# Altium footprint library Integrados.PcbLib: 96 footprints (part 6 of 6)
Each footprint in its own frame and in the unit in brackets; x right, y up, seen from the top. Pads: shape width x height; smd on the part's side, far side on the other; paste and mask are expansions set on the pad; w line width, h text height; cw(c..) or ccw(c..) is an arc to the next point about the centre after c.
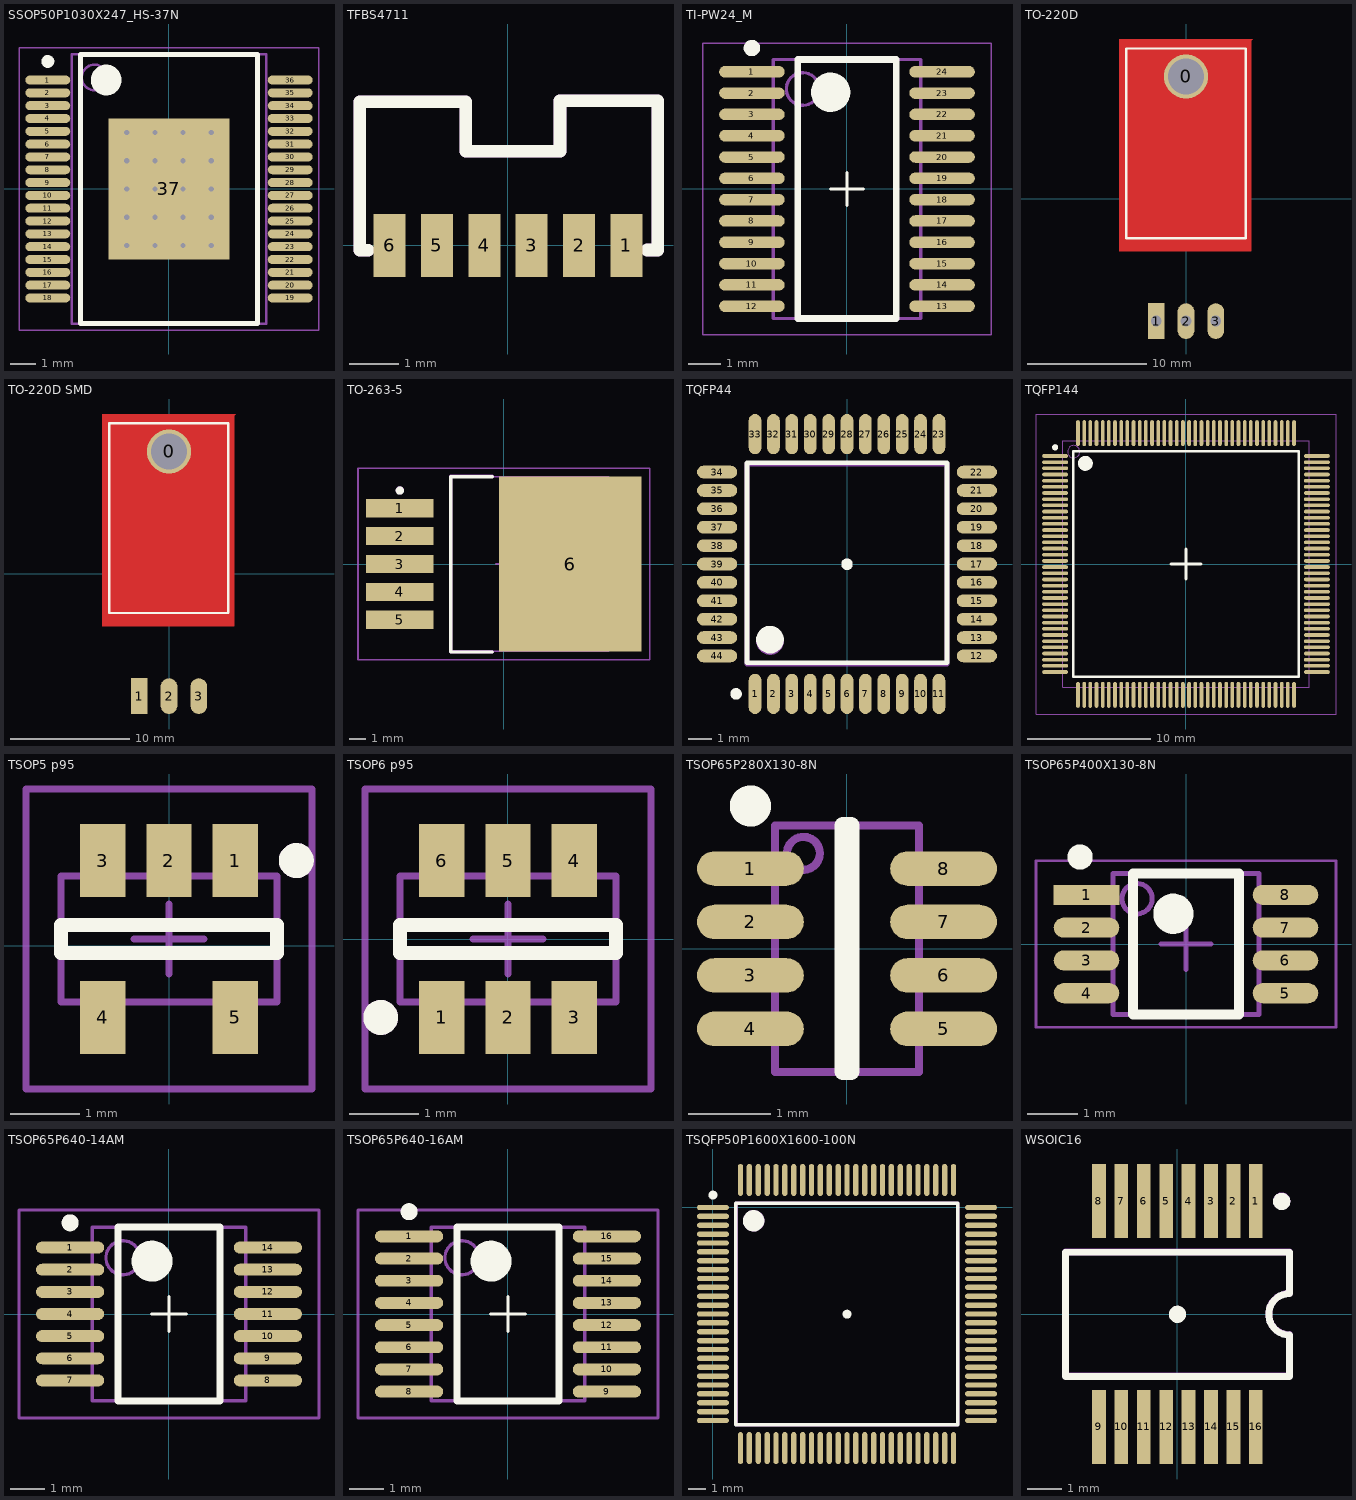
[diagram p5: the footprints below, top view; thin cyan lines are the x and y axes]

## SSOP50P1030X247_HS-37N [mm] "SSOP, 36-Leads, Body 10,30x7,50mm, Pitch 0,50mm, Thermal Pad 5,50x4,70mm, IPC Medium Density"
height 2.47
pads (37):
  oval 1.75x0.35 smd: 1(-4.725,4.25) 2(-4.725,3.75) 3(-4.725,3.25) 4(-4.725,2.75) 5(-4.725,2.25) 6(-4.725,1.75) 7(-4.725,1.25) 8(-4.725,0.75) 9(-4.725,0.25) 10(-4.725,-0.25) 11(-4.725,-0.75) 12(-4.725,-1.25) 13(-4.725,-1.75) 14(-4.725,-2.25) 15(-4.725,-2.75) 16(-4.725,-3.25) 17(-4.725,-3.75) 18(-4.725,-4.25) 19(4.725,-4.25) 20(4.725,-3.75) 21(4.725,-3.25) 22(4.725,-2.75) 23(4.725,-2.25) 24(4.725,-1.75) 25(4.725,-1.25) 26(4.725,-0.75) 27(4.725,-0.25) 28(4.725,0.25) 29(4.725,0.75) 30(4.725,1.25) 31(4.725,1.75) 32(4.725,2.25) 33(4.725,2.75) 34(4.725,3.25) 35(4.725,3.75) 36(4.725,4.25)
  rect 4.7x5.5 smd: 37(0,0)
via -1.65,2.2 diameter 0.5 hole 0.2
via -0.55,2.2 diameter 0.5 hole 0.2
via 0.55,2.2 diameter 0.5 hole 0.2
via 1.65,2.2 diameter 0.5 hole 0.2
via -1.65,1.1 diameter 0.5 hole 0.2
via -0.55,1.1 diameter 0.5 hole 0.2
via 0.55,1.1 diameter 0.5 hole 0.2
via 1.65,1.1 diameter 0.5 hole 0.2
via -1.65,0 diameter 0.5 hole 0.2
via -0.55,0 diameter 0.5 hole 0.2
via 0.55,0 diameter 0.5 hole 0.2
via 1.65,0 diameter 0.5 hole 0.2
via -1.65,-1.1 diameter 0.5 hole 0.2
via -0.55,-1.1 diameter 0.5 hole 0.2
via 0.55,-1.1 diameter 0.5 hole 0.2
via 1.65,-1.1 diameter 0.5 hole 0.2
via -1.65,-2.2 diameter 0.5 hole 0.2
via -0.55,-2.2 diameter 0.5 hole 0.2
via 0.55,-2.2 diameter 0.5 hole 0.2
via 1.65,-2.2 diameter 0.5 hole 0.2
Top Overlay:
  circle w0.25: c-4.725,4.975 r0.125
  circle w0.6: c-2.45,4.25 r0.3
  circle w0.25: c0,-0.01 r0.125
  lines w0.2: -3.45,-5.25 -3.45,5.25 3.45,5.25 3.45,-5.25 -3.45,-5.25
Mechanical 15:
  lines w0.05: -5.85,-5.5 -5.85,5.5 5.85,5.5 5.85,-5.5 -5.85,-5.5
  lines w0.1: -0.5,0 0.5,0 ; 0,-0.5 0,0.5
Mechanical 29:
  circle w0.1: c-2.9,4.35 r0.5
  lines w0.1: -3.8,-5.25 -3.8,5.25 3.8,5.25 3.8,-5.25 -3.8,-5.25
  text "'.Designator'" at -0.039,0.372 h0.5
3D body "SSOP50P1030X247_HS-37N.step": height 2.47, standoff 0, extent -5.15,-5.25 5.15,5.25

## TFBS4711 [mm] "TXRX IRDA 115.2KBIT 1.9MM 6-SMD"
pads (6):
  rect 0.64x1.27 smd: 1(2.375,0) 2(1.425,0) 3(0.475,0) 4(-0.475,0) 5(-1.425,0) 6(-2.375,0)
Top Overlay:
  lines w0.254: -2.975,-0.1 -2.805,-0.1 ; -2.975,-0.09 -2.975,2.88 -0.845,2.88 -0.845,1.89 1.045,1.89 1.045,2.9 3.005,2.9 3.005,2.88 3.005,-0.09 2.795,-0.09
Mechanical 29:
  lines w0.254: -2.975,-0.1 -2.805,-0.1 ; -2.975,-0.09 -2.975,2.88 -0.845,2.88 -0.845,1.89 1.045,1.89 1.045,2.9 3.005,2.9 3.005,2.88 3.005,-0.09 2.795,-0.09
  text "'.Designator'" at -2.772,1.001 h0.5
3D body "TFBS4711.STEP": height 1.91, standoff -0.01, extent -2.985,-0.1 3.015,2.91

## TI-PW24_M [mm] "SOP, 24-Leads, Body 7.8x4.4mm, Pitch 0.65mm, IPC Low Density"
height 1.2
pads (24):
  oval 2x0.35 smd: 1(-2.9,3.575) 2(-2.9,2.925) 3(-2.9,2.275) 4(-2.9,1.625) 5(-2.9,0.975) 6(-2.9,0.325) 7(-2.9,-0.325) 8(-2.9,-0.975) 9(-2.9,-1.625) 10(-2.9,-2.275) 11(-2.9,-2.925) 12(-2.9,-3.575) 13(2.9,-3.575) 14(2.9,-2.925) 15(2.9,-2.275) 16(2.9,-1.625) 17(2.9,-0.975) 18(2.9,-0.325) 19(2.9,0.325) 20(2.9,0.975) 21(2.9,1.625) 22(2.9,2.275) 23(2.9,2.925) 24(2.9,3.575)
Top Overlay:
  circle w0.25: c-2.9,4.3 r0.125
  circle w0.6: c-0.5,2.95 r0.3
  lines w0.1: -0.5,0 0.5,0 ; 0,-0.5 0,0.5
  lines w0.2: -1.5,-3.95 -1.5,3.95 1.5,3.95 1.5,-3.95 -1.5,-3.95
Mechanical 15:
  lines w0.05: -4.4,-4.45 -4.4,4.45 4.4,4.45 4.4,-4.45 -4.4,-4.45
Mechanical 29:
  circle w0.1: c-1.35,3.05 r0.5
  lines w0.1: -2.25,-3.95 -2.25,3.95 2.25,3.95 2.25,-3.95 -2.25,-3.95
  text "'.Designator'" at 0.039,-0.382 h0.5
3D body: height 1.2, standoff 0.05, extent -2.25,-3.95 2.25,3.95

## TO-220D [mm] "TO-220D acostado"
pads (4):
  round 3.7 hole 3: 0(0,10.25)
  rect 1.4x3 hole 0.9: 1(-2.5,-10.25)
  oval 1.4x3 hole 0.9: 2(0,-10.25) 3(2.5,-10.25)
Top Layer:
  region: -5.588,13.387 5.588,13.387 5.461,13.26 5.461,-4.393 -5.588,-4.393
Top Overlay:
  lines w0.2: -5,-3.31 0,-3.31 5,-3.31 5,12.59 -5,12.59 -5,-3.31
Mechanical 29:
  lines w0.2: -5,-3.25 -5,12.65 5,12.65 5,-3.25 0,-3.25 -5,-3.25
  text "'.Designator'" at -2.812,-3.589 h0.5
3D body "T0220-A.STEP": height 4, standoff -0.74, extent -4.988,-10.428 5.012,12.722

## TO-220D SMD [mm] "TO-220D acostado"
pads (4):
  round 3.7 hole 3: 0(0,10.25)
  rect 1.4x3 smd: 1(-2.5,-10.25)
  oval 1.4x3 smd: 2(0,-10.25) 3(2.5,-10.25)
Top Layer:
  region: -5.588,13.387 5.588,13.387 5.461,13.26 5.461,-4.393 -5.588,-4.393
Top Overlay:
  lines w0.2: -5.02,-3.29 -5.02,12.61 4.98,12.61 4.98,-3.29 -0.02,-3.29 -5.02,-3.29
Mechanical 29:
  lines w0.2: -5,-3.25 0,-3.25 5,-3.25 5,12.65 -5,12.65 -5,-3.25
  text "'.Designator'" at -0.01,-0.1 h0.5
3D body "TO-220-1 SMD.STEP": height 4.5, standoff 0, extent -4.938,-10.525 4.962,12.885

## TO-263-5 [mm] "D2-PAK, 6-Leads, Body 9x10.2mm, Pitch 1.7mm, Lead Span 15.2mm, IPC Low Density"
height 4.83
pads (6):
  rect 4.1x1.1 smd: 1(-6.35,3.4) 2(-6.35,1.7) 3(-6.35,0) 4(-6.35,-1.7) 5(-6.35,-3.4)
  rect 8.7x10.7 smd: 6(4.05,0)
Top Overlay:
  circle w0.25: c-6.35,4.48 r0.125
  lines w0.2: -0.7,-5.37 -3.25,-5.37 -3.25,5.33 -0.7,5.33
Mechanical 13:
  lines w0.1: -3.25,-5.325 6.4,-5.325 6.4,5.325 -3.25,5.325 -3.25,-5.325
Mechanical 29:
  circle w0.25: c-6.35,4.5 r0.125
  lines w0.1: -0.5,0 0.5,0 ; 0,-0.5 0,0.5 ; -8.9,-5.85 8.9,-5.85 8.9,5.85 -8.9,5.85 -8.9,-5.85
  lines w0.2: -0.7,-5.35 -3.25,-5.35 -3.25,5.35 -0.7,5.35
  text "'.Designator'" at -0.352,-0.069 h0.5
3D body "TO-263-5.STEP": height 4.56, standoff 0, extent -7.259,-5.054 6.756,5.106

## TQFP44 [mm]
pads (44):
  oval 0.55x1.75 smd: 1(-4,-5.65) 2(-3.2,-5.65) 3(-2.4,-5.65) 4(-1.6,-5.65) 5(-0.8,-5.65) 6(0,-5.65) 7(0.8,-5.65) 8(1.6,-5.65) 9(2.4,-5.65) 10(3.2,-5.65) 11(4,-5.65) 23(4,5.65) 24(3.2,5.65) 25(2.4,5.65) 26(1.6,5.65) 27(0.8,5.65) 28(0,5.65) 29(-0.8,5.65) 30(-1.6,5.65) 31(-2.4,5.65) 32(-3.2,5.65) 33(-4,5.65)
  oval 1.75x0.55 smd: 12(5.65,-4) 13(5.65,-3.2) 14(5.65,-2.4) 15(5.65,-1.6) 16(5.65,-0.8) 17(5.65,0) 18(5.65,0.8) 19(5.65,1.6) 20(5.65,2.4) 21(5.65,3.2) 22(5.65,4) 34(-5.65,4) 35(-5.65,3.2) 36(-5.65,2.4) 37(-5.65,1.6) 38(-5.65,0.8) 39(-5.65,0) 40(-5.65,-0.8) 41(-5.65,-1.6) 42(-5.65,-2.4) 43(-5.65,-3.2) 44(-5.65,-4)
Top Overlay:
  circle w0.25: c0,-0.01 r0.125
  circle w0.25: c-4.825,-5.65 r0.125
  circle w0.6: c-3.35,-3.29 r0.3
  lines w0.2: -4.35,-4.29 4.35,-4.29 4.35,4.41 -4.35,4.41 -4.35,-4.29
Mechanical 29:
  circle w0.6: c-3.35,-3.35 r0.3
  lines w0.2: -4.35,-4.35 -4.35,4.35 4.35,4.35 4.35,-4.35 -4.35,-4.35
  text "'.Designator'" at -0.342,-0.019 h0.5
3D body "TQFP44-1.step": height 1.1, standoff 0, extent -6.048,-6.048 5.969,5.969

## TQFP144 [mm] "144-Pin Plastic Thin Quad Flat Pack (TQFP144), IPC Low Density"
height 1.6
pads (144):
  oval 2.1x0.3 smd: 1(-10.6,8.75) 2(-10.6,8.25) 3(-10.6,7.75) 4(-10.6,7.25) 5(-10.6,6.75) 6(-10.6,6.25) 7(-10.6,5.75) 8(-10.6,5.25) 9(-10.6,4.75) 10(-10.6,4.25) 11(-10.6,3.75) 12(-10.6,3.25) 13(-10.6,2.75) 14(-10.6,2.25) 15(-10.6,1.75) 16(-10.6,1.25) 17(-10.6,0.75) 18(-10.6,0.25) 19(-10.6,-0.25) 20(-10.6,-0.75) 21(-10.6,-1.25) 22(-10.6,-1.75) 23(-10.6,-2.25) 24(-10.6,-2.75) 25(-10.6,-3.25) 26(-10.6,-3.75) 27(-10.6,-4.25) 28(-10.6,-4.75) 29(-10.6,-5.25) 30(-10.6,-5.75) 31(-10.6,-6.25) 32(-10.6,-6.75) 33(-10.6,-7.25) 34(-10.6,-7.75) 35(-10.6,-8.25) 36(-10.6,-8.75) 73(10.6,-8.75) 74(10.6,-8.25) 75(10.6,-7.75) 76(10.6,-7.25) 77(10.6,-6.75) 78(10.6,-6.25) 79(10.6,-5.75) 80(10.6,-5.25) 81(10.6,-4.75) 82(10.6,-4.25) 83(10.6,-3.75) 84(10.6,-3.25) 85(10.6,-2.75) 86(10.6,-2.25) 87(10.6,-1.75) 88(10.6,-1.25) 89(10.6,-0.75) 90(10.6,-0.25) 91(10.6,0.25) 92(10.6,0.75) 93(10.6,1.25) 94(10.6,1.75) 95(10.6,2.25) 96(10.6,2.75) 97(10.6,3.25) 98(10.6,3.75) 99(10.6,4.25) 100(10.6,4.75) 101(10.6,5.25) 102(10.6,5.75) 103(10.6,6.25) 104(10.6,6.75) 105(10.6,7.25) 106(10.6,7.75) 107(10.6,8.25) 108(10.6,8.75)
  oval 0.3x2.1 smd: 37(-8.75,-10.6) 38(-8.25,-10.6) 39(-7.75,-10.6) 40(-7.25,-10.6) 41(-6.75,-10.6) 42(-6.25,-10.6) 43(-5.75,-10.6) 44(-5.25,-10.6) 45(-4.75,-10.6) 46(-4.25,-10.6) 47(-3.75,-10.6) 48(-3.25,-10.6) 49(-2.75,-10.6) 50(-2.25,-10.6) 51(-1.75,-10.6) 52(-1.25,-10.6) 53(-0.75,-10.6) 54(-0.25,-10.6) 55(0.25,-10.6) 56(0.75,-10.6) 57(1.25,-10.6) 58(1.75,-10.6) 59(2.25,-10.6) 60(2.75,-10.6) 61(3.25,-10.6) 62(3.75,-10.6) 63(4.25,-10.6) 64(4.75,-10.6) 65(5.25,-10.6) 66(5.75,-10.6) 67(6.25,-10.6) 68(6.75,-10.6) 69(7.25,-10.6) 70(7.75,-10.6) 71(8.25,-10.6) 72(8.75,-10.6) 109(8.75,10.6) 110(8.25,10.6) 111(7.75,10.6) 112(7.25,10.6) 113(6.75,10.6) 114(6.25,10.6) 115(5.75,10.6) 116(5.25,10.6) 117(4.75,10.6) 118(4.25,10.6) 119(3.75,10.6) 120(3.25,10.6) 121(2.75,10.6) 122(2.25,10.6) 123(1.75,10.6) 124(1.25,10.6) 125(0.75,10.6) 126(0.25,10.6) 127(-0.25,10.6) 128(-0.75,10.6) 129(-1.25,10.6) 130(-1.75,10.6) 131(-2.25,10.6) 132(-2.75,10.6) 133(-3.25,10.6) 134(-3.75,10.6) 135(-4.25,10.6) 136(-4.75,10.6) 137(-5.25,10.6) 138(-5.75,10.6) 139(-6.25,10.6) 140(-6.75,10.6) 141(-7.25,10.6) 142(-7.75,10.6) 143(-8.25,10.6) 144(-8.75,10.6)
Top Overlay:
  circle w0.6: c-8.15,8.15 r0.3
  circle w0.25: c-10.6,9.45 r0.125
  lines w0.2: -9.15,-9.15 9.15,-9.15 9.15,9.15 -9.15,9.15 -9.15,-9.15
  lines w0.254: -1.22,0 0,0 ; 0,-1.22 0,0 ; 0,1.22 0,0 ; 1.22,0 0,0
Mechanical 15:
  lines w0.1: -0.5,0 0.5,0 ; 0,-0.5 0,0.5 ; -12.15,-12.15 12.15,-12.15 12.15,12.15 -12.15,12.15 -12.15,-12.15
Mechanical 29:
  circle w0.1: c-9.1,9.1 r0.5
  lines w0.1: -10,-10 10,-10 10,10 -10,10 -10,-10
  text "'.Designator'" at -0.392,-0.019 h0.5
3D body "TQFP144.step": height 1.1, standoff 0, extent -11.019,-10.994 10.998,11.024

## TSOP5 p95 [mm]
pads (5):
  rect 0.65x1.05 smd: 1(0.95,1.225) 2(0,1.225) 3(-0.95,1.225) 4(-0.95,-1.025) 5(0.95,-1.025)
Top Overlay:
  circle w0.25: c1.825,1.225 r0.125
  lines w0.2: -1.55,-0.1 -1.55,0.3 1.55,0.3 1.55,-0.1 -1.55,-0.1
Mechanical 15:
  lines w0.1: -0.5,0.1 0.5,0.1 ; 0,-0.4 0,0.6 ; -2.05,-2.05 2.05,-2.05 2.05,2.25 -2.05,2.25 -2.05,-2.05
Mechanical 29:
  circle w0.25: c1.825,1.225 r0.125
  lines w0.1: -1.55,-0.8 -1.55,1 1.55,1 1.55,-0.8 -1.55,-0.8
  text "'.Designator'" at 0.371,0.118 h0.5
Mechanical 30:
  circle w0.25: c1.825,1.225 r0.125
  lines w0.1: -1.55,-0.8 -1.55,1 1.55,1 1.55,-0.8 -1.55,-0.8
  text "'.Designator'" at 0.371,0.118 h0.5
3D body "5-TSOP.step": height 1, standoff -0.1, extent -1.55,-1.45 1.55,1.55

## TSOP6 p95 [mm]
pads (6):
  rect 0.65x1.05 smd: 1(-0.95,-1.125) 2(0,-1.125) 3(0.95,-1.125) 4(0.95,1.125) 5(0,1.125) 6(-0.95,1.125)
Top Overlay:
  circle w0.25: c-1.825,-1.125 r0.125
  lines w0.2: -1.55,-0.2 -1.55,0.2 1.55,0.2 1.55,-0.2 -1.55,-0.2
Mechanical 15:
  lines w0.1: -0.5,0 0.5,0 ; 0,-0.5 0,0.5 ; -2.05,-2.15 2.05,-2.15 2.05,2.15 -2.05,2.15 -2.05,-2.15
Mechanical 29:
  circle w0.25: c-1.825,-1.125 r0.125
  lines w0.1: -1.55,-0.9 1.55,-0.9 1.55,0.9 -1.55,0.9 -1.55,-0.9
  text "'.Designator'" at -0.372,-0.019 h0.5
3D body: height 0, standoff 0, extent -1.55,-0.9 1.55,0.9
3D body "User Library-TSOP-6.step": height 1, standoff 0, extent -1.5,-1.35 1.5,1.35

## TSOP65P280X130-8N [mm] "TSOP, 8-Leads, Body 3,0x1,8mm (max), Pitch 0,65mm, IPC Medium Density"
height 1.3
pads (8):
  oval 1.3x0.42 smd: 1(-1.175,0.975) 2(-1.175,0.325) 3(-1.175,-0.325) 4(-1.175,-0.975) 5(1.175,-0.975) 6(1.175,-0.325) 7(1.175,0.325) 8(1.175,0.975)
Top Overlay:
  circle w0.25: c-1.175,1.735 r0.125
  lines w0.2: -0.05,-1.5 0.05,-1.5 0.05,1.5 -0.05,1.5 -0.05,-1.5
Mechanical 29:
  circle w0.1: c-0.53,1.16 r0.2
  lines w0.1: -0.875,-1.5 0.875,-1.5 0.875,1.5 -0.875,1.5 -0.875,-1.5
  text "'.Designator'" at 0.229,-1.372 h0.5
3D body "SOT23-8.step": height 1.11, standoff 0, extent -1.376,-1.499 1.427,1.501

## TSOP65P400X130-8N [mm] "TSOP, 8-Leads, Body 2,95x2,80mm, Pitch 0,65mm, IPC Medium Density"
height 1.3
pads (8):
  rect 1.3x0.4 smd: 1(-1.973,0.975)
  oval 1.3x0.4 smd: 2(-1.973,0.325) 3(-1.973,-0.325) 4(-1.973,-0.975) 5(1.973,-0.975) 6(1.973,-0.325) 7(1.973,0.325) 8(1.973,0.975)
Top Overlay:
  circle w0.25: c-2.1,1.725 r0.125
  circle w0.4: c-0.25,0.6 r0.2
  lines w0.2: -1.05,-1.4 -1.05,1.4 1.05,1.4 1.05,-1.4 -1.05,-1.4
Mechanical 15:
  lines w0.05: -2.975,-1.65 -2.975,1.65 2.975,1.65 2.975,-1.65 -2.975,-1.65
  lines w0.1: -0.5,0 0.5,0 ; 0,-0.5 0,0.5
Mechanical 29:
  circle w0.1: c-0.97,0.9 r0.3
  lines w0.1: -1.45,-1.4 -1.45,1.4 1.45,1.4 1.45,-1.4 -1.45,-1.4
  text "'.Designator'" at -0.23,1.19 h0.5
3D body "TSOP65P400X130-8N.step": height 1.3, standoff 0, extent -2,-1.4 2,1.4

## TSOP65P640-14AM [mm] "TSOP, 14-Leads, Body 5x4.4mm, Pitch 0.65mm, IPC Low Density"
height 1.2
pads (14):
  oval 2x0.35 smd: 1(-2.9,1.95) 2(-2.9,1.3) 3(-2.9,0.65) 4(-2.9,0) 5(-2.9,-0.65) 6(-2.9,-1.3) 7(-2.9,-1.95) 8(2.9,-1.95) 9(2.9,-1.3) 10(2.9,-0.65) 11(2.9,0) 12(2.9,0.65) 13(2.9,1.3) 14(2.9,1.95)
Top Overlay:
  circle w0.6: c-0.5,1.55 r0.3
  circle w0.25: c-2.9,2.675 r0.125
  lines w0.1: -0.5,0 0.5,0 ; 0,-0.5 0,0.5
  lines w0.2: -1.5,-2.55 1.5,-2.55 1.5,2.55 -1.5,2.55 -1.5,-2.55
Mechanical 15:
  lines w0.1: -4.4,-3.05 4.4,-3.05 4.4,3.05 -4.4,3.05 -4.4,-3.05
Mechanical 29:
  circle w0.1: c-1.35,1.65 r0.5
  lines w0.1: -2.25,-2.55 2.25,-2.55 2.25,2.55 -2.25,2.55 -2.25,-2.55
  text "'.Designator'" at -0.169,2.352 h0.5
3D body "tssop14-2.step": height 1.2, standoff 0, extent -3.225,-2.55 3.175,2.55

## TSOP65P640-16AM [mm] "TSOP, 16-Leads, Body 5x4.4mm, Pitch 0.65mm, IPC Low Density"
height 1.1
pads (16):
  oval 2x0.35 smd: 1(-2.9,2.275) 2(-2.9,1.625) 3(-2.9,0.975) 4(-2.9,0.325) 5(-2.9,-0.325) 6(-2.9,-0.975) 7(-2.9,-1.625) 8(-2.9,-2.275) 9(2.9,-2.275) 10(2.9,-1.625) 11(2.9,-0.975) 12(2.9,-0.325) 13(2.9,0.325) 14(2.9,0.975) 15(2.9,1.625) 16(2.9,2.275)
Top Overlay:
  circle w0.6: c-0.5,1.55 r0.3
  circle w0.25: c-2.9,3 r0.125
  lines w0.1: -0.5,0 0.5,0 ; 0,-0.5 0,0.5
  lines w0.2: -1.5,-2.55 1.5,-2.55 1.5,2.55 -1.5,2.55 -1.5,-2.55
Mechanical 15:
  lines w0.1: -4.4,-3.05 4.4,-3.05 4.4,3.05 -4.4,3.05 -4.4,-3.05
Mechanical 29:
  circle w0.1: c-1.35,1.65 r0.5
  lines w0.1: -2.25,-2.55 2.25,-2.55 2.25,2.55 -2.25,2.55 -2.25,-2.55
  text "'.Designator'" at -0.179,2.372 h0.5
3D body "SSOP16.step": height 1.1, standoff 0, extent -3.048,-2.438 2.947,2.54

## TSQFP50P1600X1600-100N [mm] "Thin QFP, 100-Leads, Body 14x14mm, Pitch 0.5mm, IPC Medium Density"
height 1.6
pads (100):
  oval 1.8x0.3 smd: 1(0,0) 2(0,-0.5) 3(0,-1) 4(0,-1.5) 5(0,-2) 6(0,-2.5) 7(0,-3) 8(0,-3.5) 9(0,-4) 10(0,-4.5) 11(0,-5) 12(0,-5.5) 13(0,-6) 14(0,-6.5) 15(0,-7) 16(0,-7.5) 17(0,-8) 18(0,-8.5) 19(0,-9) 20(0,-9.5) 21(0,-10) 22(0,-10.5) 23(0,-11) 24(0,-11.5) 25(0,-12) 51(15.1,-12) 52(15.1,-11.5) 53(15.1,-11) 54(15.1,-10.5) 55(15.1,-10) 56(15.1,-9.5) 57(15.1,-9) 58(15.1,-8.5) 59(15.1,-8) 60(15.1,-7.5) 61(15.1,-7) 62(15.1,-6.5) 63(15.1,-6) 64(15.1,-5.5) 65(15.1,-5) 66(15.1,-4.5) 67(15.1,-4) 68(15.1,-3.5) 69(15.1,-3) 70(15.1,-2.5) 71(15.1,-2) 72(15.1,-1.5) 73(15.1,-1) 74(15.1,-0.5) 75(15.1,0)
  oval 0.3x1.8 smd: 26(1.55,-13.55) 27(2.05,-13.55) 28(2.55,-13.55) 29(3.05,-13.55) 30(3.55,-13.55) 31(4.05,-13.55) 32(4.55,-13.55) 33(5.05,-13.55) 34(5.55,-13.55) 35(6.05,-13.55) 36(6.55,-13.55) 37(7.05,-13.55) 38(7.55,-13.55) 39(8.05,-13.55) 40(8.55,-13.55) 41(9.05,-13.55) 42(9.55,-13.55) 43(10.05,-13.55) 44(10.55,-13.55) 45(11.05,-13.55) 46(11.55,-13.55) 47(12.05,-13.55) 48(12.55,-13.55) 49(13.05,-13.55) 50(13.55,-13.55) 76(13.55,1.55) 77(13.05,1.55) 78(12.55,1.55) 79(12.05,1.55) 80(11.55,1.55) 81(11.05,1.55) 82(10.55,1.55) 83(10.05,1.55) 84(9.55,1.55) 85(9.05,1.55) 86(8.55,1.55) 87(8.05,1.55) 88(7.55,1.55) 89(7.05,1.55) 90(6.55,1.55) 91(6.05,1.55) 92(5.55,1.55) 93(5.05,1.55) 94(4.55,1.55) 95(4.05,1.55) 96(3.55,1.55) 97(3.05,1.55) 98(2.55,1.55) 99(2.05,1.55) 100(1.55,1.55)
Top Overlay:
  circle w0.25: c7.55,-6.01 r0.125
  circle w0.6: c2.29,-0.75 r0.3
  circle w0.25: c0,0.7 r0.125
  lines w0.2: 1.29,-12.25 1.29,0.25 13.79,0.25 13.79,-12.25 1.29,-12.25
Mechanical 29:
  circle w0.6: c2.3,-0.75 r0.3
  lines w0.2: 1.3,-12.25 13.8,-12.25 13.8,0.25 1.3,0.25 1.3,-12.25
  text "'.Designator'" at 4.75,-6.03 h0.5
3D body "TQFP100-1.STEP": height 1.61, standoff -0.01, extent -0.455,-13.995 15.545,2.005

## WSOIC16 [mm] "SOIC16-300"
pads (16):
  rect 0.4x2.15 smd: 1(2.275,3.275) 2(1.625,3.275) 3(0.975,3.275) 4(0.325,3.275) 5(-0.325,3.275) 6(-0.975,3.275) 7(-1.625,3.275) 8(-2.275,3.275) 9(-2.275,-3.275) 10(-1.625,-3.275) 11(-0.975,-3.275) 12(-0.325,-3.275) 13(0.325,-3.275) 14(0.975,-3.275) 15(1.625,-3.275) 16(2.275,-3.275)
Top Overlay:
  circle w0.25: c0,-0.01 r0.125
  circle w0.25: c3.025,3.265 r0.125
  lines w0.2: -3.25,-1.81 3.25,-1.81 3.25,-0.61 cw(c3.25,-0.01) 3.25,0.59 3.25,1.79 -3.25,1.79 -3.25,-1.81
Mechanical 29:
  circle w0.25: c3.025,3.275 r0.125
  lines w0.2: -3.25,-1.8 -3.25,1.8 3.25,1.8 3.25,0.6 ccw(c3.25,0) 3.25,-0.6 3.25,-1.8 -3.25,-1.8
  text "'.Designator'" at 2.457,0.294 h0.5
3D body "ssop-16 pos.step": height 1.99, standoff 0.01, extent -3.186,-3.977 3.138,3.923